# Altium schematic symbol library jlcpcb_2025_04_capacitors_extended_1210.schlib: 709 symbols (part 3 of 4) (continued)
## CL32X107MQVNNNE
designator C?  Capacitance: 100000000pF  (hidden comment: *)
Capacitor, Ceramic (MLCC), 100000000pF, ±20%, 6.3V, X6S, ±20%, SMD 1210; Manufacturer: Samsung Electro-Mechanics; Manufacturer Part Number: CL32X107MQVNNNE; Package Size: 1210; JLCPCB Basic Part: No; JLCPCB Part Number: C3039693; Supplier 1: LCSC; Category: Capacitors - MLCC; Supplier Part Number 1: C3039693; Tolerance: ±20%; Voltage Rating: 6.3V; Temperature Coefficient: X6S; RoHS: Yes; ComponentLink1Description: Datasheet; ComponentLink1URL: https://wmsc.lcsc.com/wmsc/upload/file/pdf/v2/lcsc/2206221801_Samsung-Electro-Mechanics-CL32X107MQVNNNE_C3039693.pdf; ComponentLink2Description: JLCPCB Part URL; ComponentLink2URL: https://jlcpcb.com/partdetail/C3039693; ComponentLink3Description: LCSC Part URL; ComponentLink3URL: https://lcsc.com/product-detail/Multilayer-Ceramic-Capacitors-MLCC---SMD-SMT_Samsung-Electro-Mechanics-Samsung-Electro-Mechanics-CL32X107MQVNNNE_C3039693.html; ComponentLink4Description: Samsung Component Library; ComponentLink4URL: https://weblib.samsungsem.com/mlcc/mlcc-ec.do?partNumber=CL32X107MQVNNN
footprint CAP-1210 (1210 (3225M) Capacitor)
pins: 1, 2

## CL32X107MQVNNWE
designator C?  Capacitance: 100uF  (hidden comment: *)
Capacitor, Ceramic (MLCC), 100uF, ±20%, 6.3V, X6S, ±20%, SMD 1210; Manufacturer: Samsung Electro-Mechanics; Manufacturer Part Number: CL32X107MQVNNWE; Package Size: 1210; JLCPCB Basic Part: No; JLCPCB Part Number: C2762605; Supplier 1: LCSC; Category: Capacitors - MLCC; Supplier Part Number 1: C2762605; Tolerance: ±20%; Voltage Rating: 6.3V; Temperature Coefficient: X6S; RoHS: Yes; ComponentLink1Description: Datasheet; ComponentLink1URL: https://wmsc.lcsc.com/wmsc/upload/file/pdf/v2/lcsc/2103242011_Samsung-Electro-Mechanics-CL32X107MQVNNWE_C2762605.pdf; ComponentLink2Description: JLCPCB Part URL; ComponentLink2URL: https://jlcpcb.com/partdetail/C2762605; ComponentLink3Description: LCSC Part URL; ComponentLink3URL: https://lcsc.com/product-detail/Multilayer-Ceramic-Capacitors-MLCC---SMD-SMT_Samsung-Electro-Mechanics-Samsung-Electro-Mechanics-CL32X107MQVNNWE_C2762605.html; ComponentLink4Description: Samsung Component Library; ComponentLink4URL: https://weblib.samsungsem.com/mlcc/mlcc-ec.do?partNumber=CL32X107MQVNNW
footprint CAP-1210 (1210 (3225M) Capacitor)
pins: 1, 2

## CL32Y106KBJ4PNE
designator C?  Capacitance: 10uF  (hidden comment: *)
Capacitor, Ceramic (MLCC), 10uF, ±10%, 50V, X7S, ±10%, SMD 1210; Manufacturer: Samsung Electro-Mechanics; Manufacturer Part Number: CL32Y106KBJ4PNE; Package Size: 1210; JLCPCB Basic Part: No; JLCPCB Part Number: C307374; Supplier 1: LCSC; Category: Capacitors - MLCC; Supplier Part Number 1: C307374; Tolerance: ±10%; Voltage Rating: 50V; Temperature Coefficient: X7S; RoHS: Yes; ComponentLink1Description: Datasheet; ComponentLink1URL: https://wmsc.lcsc.com/wmsc/upload/file/pdf/v2/lcsc/2304140030_Samsung-Electro-Mechanics-CL32Y106KBJ4PNE_C307374.pdf; ComponentLink2Description: JLCPCB Part URL; ComponentLink2URL: https://jlcpcb.com/partdetail/C307374; ComponentLink3Description: LCSC Part URL; ComponentLink3URL: https://lcsc.com/product-detail/Multilayer-Ceramic-Capacitors-MLCC---SMD-SMT_Samsung-Electro-Mechanics-Samsung-Electro-Mechanics-CL32Y106KBJ4PNE_C307374.html; ComponentLink4Description: Samsung Component Library; ComponentLink4URL: https://weblib.samsungsem.com/mlcc/mlcc-ec.do?partNumber=CL32Y106KBJ4PN
footprint CAP-1210 (1210 (3225M) Capacitor)
pins: 1, 2

## CL32Y106KBJVPJE
designator C?  Capacitance: 10uF  (hidden comment: *)
Capacitor, Ceramic (MLCC), 10uF, 50V, SMD 1210; Manufacturer: Samsung Electro-Mechanics; Manufacturer Part Number: CL32Y106KBJVPJE; Package Size: 1210; JLCPCB Basic Part: No; JLCPCB Part Number: C2803393; Supplier 1: LCSC; Category: Capacitors - MLCC; Supplier Part Number 1: C2803393; Voltage Rating: 50V; RoHS: Yes; ComponentLink1Description: Datasheet; ComponentLink1URL: https://wmsc.lcsc.com/wmsc/upload/file/pdf/v2/lcsc/2304140030_Samsung-Electro-Mechanics-CL32Y106KBJVPJE_C2803393.pdf; ComponentLink2Description: JLCPCB Part URL; ComponentLink2URL: https://jlcpcb.com/partdetail/C2803393; ComponentLink3Description: LCSC Part URL; ComponentLink3URL: https://lcsc.com/product-detail/Multilayer-Ceramic-Capacitors-MLCC---SMD-SMT_Samsung-Electro-Mechanics-Samsung-Electro-Mechanics-CL32Y106KBJVPJE_C2803393.html; ComponentLink4Description: Samsung Component Library; ComponentLink4URL: https://weblib.samsungsem.com/mlcc/mlcc-ec.do?partNumber=CL32Y106KBJVPJ
footprint CAP-1210 (1210 (3225M) Capacitor)
pins: 1, 2

## CL32Y226KAVVPNE
designator C?  Capacitance: 22uF  (hidden comment: *)
Capacitor, Ceramic (MLCC), 22uF, 25V, SMD 1210; Manufacturer: Samsung Electro-Mechanics; Manufacturer Part Number: CL32Y226KAVVPNE; Package Size: 1210; JLCPCB Basic Part: No; JLCPCB Part Number: C2803395; Supplier 1: LCSC; Category: Capacitors - MLCC; Supplier Part Number 1: C2803395; Voltage Rating: 25V; RoHS: Yes; ComponentLink1Description: Datasheet; ComponentLink1URL: https://wmsc.lcsc.com/wmsc/upload/file/pdf/v2/lcsc/2304140030_Samsung-Electro-Mechanics-CL32Y226KAVVPNE_C2803395.pdf; ComponentLink2Description: JLCPCB Part URL; ComponentLink2URL: https://jlcpcb.com/partdetail/C2803395; ComponentLink3Description: LCSC Part URL; ComponentLink3URL: https://lcsc.com/product-detail/Multilayer-Ceramic-Capacitors-MLCC---SMD-SMT_Samsung-Electro-Mechanics-Samsung-Electro-Mechanics-CL32Y226KAVVPNE_C2803395.html; ComponentLink4Description: Samsung Component Library; ComponentLink4URL: https://weblib.samsungsem.com/mlcc/mlcc-ec.do?partNumber=CL32Y226KAVVPN
footprint CAP-1210 (1210 (3225M) Capacitor)
pins: 1, 2

## CL32Y475KCIVPNE
designator C?  Capacitance: 4.7uF  (hidden comment: *)
Capacitor, Ceramic (MLCC), 4.7uF, ±10%, 100V, X7S, ±10%, SMD 1210; Manufacturer: Samsung Electro-Mechanics; Manufacturer Part Number: CL32Y475KCIVPNE; Package Size: 1210; JLCPCB Basic Part: No; JLCPCB Part Number: C2803397; Supplier 1: LCSC; Category: Capacitors - MLCC; Supplier Part Number 1: C2803397; Tolerance: ±10%; Voltage Rating: 100V; Temperature Coefficient: X7S; RoHS: Yes; ComponentLink1Description: Datasheet; ComponentLink1URL: https://wmsc.lcsc.com/wmsc/upload/file/pdf/v2/lcsc/2202131900_Samsung-Electro-Mechanics-CL32Y475KCIVPNE_C2803397.pdf; ComponentLink2Description: JLCPCB Part URL; ComponentLink2URL: https://jlcpcb.com/partdetail/C2803397; ComponentLink3Description: LCSC Part URL; ComponentLink3URL: https://lcsc.com/product-detail/Multilayer-Ceramic-Capacitors-MLCC---SMD-SMT_Samsung-Electro-Mechanics-Samsung-Electro-Mechanics-CL32Y475KCIVPNE_C2803397.html; ComponentLink4Description: Samsung Component Library; ComponentLink4URL: https://weblib.samsungsem.com/mlcc/mlcc-ec.do?partNumber=CL32Y475KCIVPN
footprint CAP-1210 (1210 (3225M) Capacitor)
pins: 1, 2

## CNA6P1X7R1H106KT000A
designator C?  Capacitance: 10uF  (hidden comment: *)
Capacitor, Ceramic (MLCC), 10uF, ±10%, 50V, X7R, ±10%, SMD 1210; Manufacturer: TDK; Manufacturer Part Number: CNA6P1X7R1H106KT000A; Package Size: 1210; JLCPCB Basic Part: No; JLCPCB Part Number: C694544; Supplier 1: LCSC; Category: Capacitors - MLCC; Supplier Part Number 1: C694544; Tolerance: ±10%; Voltage Rating: 50V; Temperature Coefficient: X7R; RoHS: Yes; ComponentLink1Description: Datasheet; ComponentLink1URL: https://wmsc.lcsc.com/wmsc/upload/file/pdf/v2/lcsc/2011021105_TDK-CNA6P1X7R1H106KT000A_C694544.pdf; ComponentLink2Description: JLCPCB Part URL; ComponentLink2URL: https://jlcpcb.com/partdetail/C694544; ComponentLink3Description: LCSC Part URL; ComponentLink3URL: https://lcsc.com/product-detail/Multilayer-Ceramic-Capacitors-MLCC---SMD-SMT_TDK-TDK-CNA6P1X7R1H106KT000A_C694544.html
footprint CAP-1210 (1210 (3225M) Capacitor)
pins: 1, 2

## CS3225X5R226K160NRL
designator C?  Capacitance: 22uF  (hidden comment: *)
Capacitor, Ceramic (MLCC), 22uF, ±10%, 16V, X5R, ±10%, SMD 1210; Manufacturer: Samwha Capacitor; Manufacturer Part Number: CS3225X5R226K160NRL; Package Size: 1210; JLCPCB Basic Part: No; JLCPCB Part Number: C2918506; Supplier 1: LCSC; Category: Capacitors - MLCC; Supplier Part Number 1: C2918506; Tolerance: ±10%; Voltage Rating: 16V; Temperature Coefficient: X5R; RoHS: Yes; ComponentLink1Description: Datasheet; ComponentLink1URL: https://wmsc.lcsc.com/wmsc/upload/file/pdf/v2/lcsc/2111172030_Samwha-Capacitor-CS3225X5R226K160NRL_C2918506.pdf; ComponentLink2Description: JLCPCB Part URL; ComponentLink2URL: https://jlcpcb.com/partdetail/C2918506; ComponentLink3Description: LCSC Part URL; ComponentLink3URL: https://lcsc.com/product-detail/Multilayer-Ceramic-Capacitors-MLCC---SMD-SMT_Samwha-Capacitor-Samwha-Capacitor-CS3225X5R226K160NRL_C2918506.html
footprint CAP-1210 (1210 (3225M) Capacitor)
pins: 1, 2

## CS3225X5R226K250NRL
designator C?  Capacitance: 22uF  (hidden comment: *)
Capacitor, Ceramic (MLCC), 22uF, ±10%, 25V, X5R, ±10%, SMD 1210; Manufacturer: Samwha Capacitor; Manufacturer Part Number: CS3225X5R226K250NRL; Package Size: 1210; JLCPCB Basic Part: No; JLCPCB Part Number: C2918488; Supplier 1: LCSC; Category: Capacitors - MLCC; Supplier Part Number 1: C2918488; Tolerance: ±10%; Voltage Rating: 25V; Temperature Coefficient: X5R; RoHS: Yes; ComponentLink1Description: Datasheet; ComponentLink1URL: https://wmsc.lcsc.com/wmsc/upload/file/pdf/v2/lcsc/2111172030_Samwha-Capacitor-CS3225X5R226K250NRL_C2918488.pdf; ComponentLink2Description: JLCPCB Part URL; ComponentLink2URL: https://jlcpcb.com/partdetail/C2918488; ComponentLink3Description: LCSC Part URL; ComponentLink3URL: https://lcsc.com/product-detail/Multilayer-Ceramic-Capacitors-MLCC---SMD-SMT_Samwha-Capacitor-Samwha-Capacitor-CS3225X5R226K250NRL_C2918488.html
footprint CAP-1210 (1210 (3225M) Capacitor)
pins: 1, 2

## CS3225X5R476K160NRL
designator C?  Capacitance: 47uF  (hidden comment: *)
Capacitor, Ceramic (MLCC), 47uF, ±10%, 16V, X5R, ±10%, SMD 1210; Manufacturer: Samwha Capacitor; Manufacturer Part Number: CS3225X5R476K160NRL; Package Size: 1210; JLCPCB Basic Part: No; JLCPCB Part Number: C2918513; Supplier 1: LCSC; Category: Capacitors - MLCC; Supplier Part Number 1: C2918513; Tolerance: ±10%; Voltage Rating: 16V; Temperature Coefficient: X5R; RoHS: Yes; ComponentLink1Description: Datasheet; ComponentLink1URL: https://wmsc.lcsc.com/wmsc/upload/file/pdf/v2/lcsc/2212021100_Samwha-Capacitor-CS3225X5R476K160NRL_C2918513.pdf; ComponentLink2Description: JLCPCB Part URL; ComponentLink2URL: https://jlcpcb.com/partdetail/C2918513; ComponentLink3Description: LCSC Part URL; ComponentLink3URL: https://lcsc.com/product-detail/Multilayer-Ceramic-Capacitors-MLCC---SMD-SMT_Samwha-Capacitor-Samwha-Capacitor-CS3225X5R476K160NRL_C2918513.html
footprint CAP-1210 (1210 (3225M) Capacitor)
pins: 1, 2

## CS3225X7R106K250NRK
designator C?  Capacitance: 10uF  (hidden comment: *)
Capacitor, Ceramic (MLCC), 10uF, ±10%, 25V, X7R, ±10%, SMD 1210; Manufacturer: Samwha Capacitor; Manufacturer Part Number: CS3225X7R106K250NRK; Package Size: 1210; JLCPCB Basic Part: No; JLCPCB Part Number: C2918497; Supplier 1: LCSC; Category: Capacitors - MLCC; Supplier Part Number 1: C2918497; Tolerance: ±10%; Voltage Rating: 25V; Temperature Coefficient: X7R; RoHS: Yes; ComponentLink1Description: Datasheet; ComponentLink1URL: https://wmsc.lcsc.com/wmsc/upload/file/pdf/v2/lcsc/2111172030_Samwha-Capacitor-CS3225X7R106K250NRK_C2918497.pdf; ComponentLink2Description: JLCPCB Part URL; ComponentLink2URL: https://jlcpcb.com/partdetail/C2918497; ComponentLink3Description: LCSC Part URL; ComponentLink3URL: https://lcsc.com/product-detail/Multilayer-Ceramic-Capacitors-MLCC---SMD-SMT_Samwha-Capacitor-Samwha-Capacitor-CS3225X7R106K250NRK_C2918497.html
footprint CAP-1210 (1210 (3225M) Capacitor)
pins: 1, 2

## CS3225X7R106K500NRL
designator C?  Capacitance: 10uF  (hidden comment: *)
Capacitor, Ceramic (MLCC), 10uF, 50V, X7R, SMD 1210; Manufacturer: Samwha Capacitor; Manufacturer Part Number: CS3225X7R106K500NRL; Package Size: 1210; JLCPCB Basic Part: No; JLCPCB Part Number: C2918502; Supplier 1: LCSC; Category: Capacitors - MLCC; Supplier Part Number 1: C2918502; Voltage Rating: 50V; Temperature Coefficient: X7R; RoHS: Yes; ComponentLink1Description: Datasheet; ComponentLink1URL: https://wmsc.lcsc.com/wmsc/upload/file/pdf/v2/lcsc/2308151448_Samwha-Capacitor-CS3225X7R106K500NRL_C2918502.pdf; ComponentLink2Description: JLCPCB Part URL; ComponentLink2URL: https://jlcpcb.com/partdetail/C2918502; ComponentLink3Description: LCSC Part URL; ComponentLink3URL: https://lcsc.com/product-detail/Multilayer-Ceramic-Capacitors-MLCC---SMD-SMT_Samwha-Capacitor-Samwha-Capacitor-CS3225X7R106K500NRL_C2918502.html
footprint CAP-1210 (1210 (3225M) Capacitor)
pins: 1, 2

## CS3225X7R225K101NRK
designator C?  Capacitance: 2.2uF  (hidden comment: *)
Capacitor, Ceramic (MLCC), 2.2uF, 100V, X7R, SMD 1210; Manufacturer: Samwha Capacitor; Manufacturer Part Number: CS3225X7R225K101NRK; Package Size: 1210; JLCPCB Basic Part: No; JLCPCB Part Number: C2900749; Supplier 1: LCSC; Category: Capacitors - MLCC; Supplier Part Number 1: C2900749; Voltage Rating: 100V; Temperature Coefficient: X7R; RoHS: Yes; ComponentLink1Description: Datasheet; ComponentLink1URL: https://wmsc.lcsc.com/wmsc/upload/file/pdf/v2/lcsc/2110141830_Samwha-Capacitor-CS3225X7R225K101NRK_C2900749.pdf; ComponentLink2Description: JLCPCB Part URL; ComponentLink2URL: https://jlcpcb.com/partdetail/C2900749; ComponentLink3Description: LCSC Part URL; ComponentLink3URL: https://lcsc.com/product-detail/Multilayer-Ceramic-Capacitors-MLCC---SMD-SMT_Samwha-Capacitor-Samwha-Capacitor-CS3225X7R225K101NRK_C2900749.html
footprint CAP-1210 (1210 (3225M) Capacitor)
pins: 1, 2

## CS3225X7R226K160NRL
designator C?  Capacitance: 22uF  (hidden comment: *)
Capacitor, Ceramic (MLCC), 22uF, 16V, X7R, SMD 1210; Manufacturer: Samwha Capacitor; Manufacturer Part Number: CS3225X7R226K160NRL; Package Size: 1210; JLCPCB Basic Part: No; JLCPCB Part Number: C2918510; Supplier 1: LCSC; Category: Capacitors - MLCC; Supplier Part Number 1: C2918510; Voltage Rating: 16V; Temperature Coefficient: X7R; RoHS: Yes; ComponentLink1Description: Datasheet; ComponentLink1URL: https://wmsc.lcsc.com/wmsc/upload/file/pdf/v2/lcsc/2111172030_Samwha-Capacitor-CS3225X7R226K160NRL_C2918510.pdf; ComponentLink2Description: JLCPCB Part URL; ComponentLink2URL: https://jlcpcb.com/partdetail/C2918510; ComponentLink3Description: LCSC Part URL; ComponentLink3URL: https://lcsc.com/product-detail/Multilayer-Ceramic-Capacitors-MLCC---SMD-SMT_Samwha-Capacitor-Samwha-Capacitor-CS3225X7R226K160NRL_C2918510.html
footprint CAP-1210 (1210 (3225M) Capacitor)
pins: 1, 2

## CS3225X7R226K250NRL
designator C?  Capacitance: 22uF  (hidden comment: *)
Capacitor, Ceramic (MLCC), 22uF, ±10%, 25V, X7R, ±10%, SMD 1210; Manufacturer: Samwha Capacitor; Manufacturer Part Number: CS3225X7R226K250NRL; Package Size: 1210; JLCPCB Basic Part: No; JLCPCB Part Number: C2918511; Supplier 1: LCSC; Category: Capacitors - MLCC; Supplier Part Number 1: C2918511; Tolerance: ±10%; Voltage Rating: 25V; Temperature Coefficient: X7R; RoHS: Yes; ComponentLink1Description: Datasheet; ComponentLink1URL: https://wmsc.lcsc.com/wmsc/upload/file/pdf/v2/lcsc/2111172030_Samwha-Capacitor-CS3225X7R226K250NRL_C2918511.pdf; ComponentLink2Description: JLCPCB Part URL; ComponentLink2URL: https://jlcpcb.com/partdetail/C2918511; ComponentLink3Description: LCSC Part URL; ComponentLink3URL: https://lcsc.com/product-detail/Multilayer-Ceramic-Capacitors-MLCC---SMD-SMT_Samwha-Capacitor-Samwha-Capacitor-CS3225X7R226K250NRL_C2918511.html
footprint CAP-1210 (1210 (3225M) Capacitor)
pins: 1, 2

## CS3225X7R476K6R3NRL
designator C?  Capacitance: 47uF  (hidden comment: *)
Capacitor, Ceramic (MLCC), 47uF, ±10%, 6.3V, X7R, ±10%, SMD 1210; Manufacturer: Samwha Capacitor; Manufacturer Part Number: CS3225X7R476K6R3NRL; Package Size: 1210; JLCPCB Basic Part: No; JLCPCB Part Number: C2918514; Supplier 1: LCSC; Category: Capacitors - MLCC; Supplier Part Number 1: C2918514; Tolerance: ±10%; Voltage Rating: 6.3V; Temperature Coefficient: X7R; RoHS: Yes; ComponentLink1Description: Datasheet; ComponentLink1URL: https://wmsc.lcsc.com/wmsc/upload/file/pdf/v2/lcsc/2111172030_Samwha-Capacitor-CS3225X7R476K6R3NRL_C2918514.pdf; ComponentLink2Description: JLCPCB Part URL; ComponentLink2URL: https://jlcpcb.com/partdetail/C2918514; ComponentLink3Description: LCSC Part URL; ComponentLink3URL: https://lcsc.com/product-detail/Multilayer-Ceramic-Capacitors-MLCC---SMD-SMT_Samwha-Capacitor-Samwha-Capacitor-CS3225X7R476K6R3NRL_C2918514.html
footprint CAP-1210 (1210 (3225M) Capacitor)
pins: 1, 2

## CS3225X7R476K100NRL
designator C?  Capacitance: 47uF  (hidden comment: *)
Capacitor, Ceramic (MLCC), 47uF, ±10%, 10V, X7R, ±10%, SMD 1210; Manufacturer: Samwha Capacitor; Manufacturer Part Number: CS3225X7R476K100NRL; Package Size: 1210; JLCPCB Basic Part: No; JLCPCB Part Number: C5189825; Supplier 1: LCSC; Category: Capacitors - MLCC; Supplier Part Number 1: C5189825; Tolerance: ±10%; Voltage Rating: 10V; Temperature Coefficient: X7R; RoHS: Yes; ComponentLink1Description: Datasheet; ComponentLink1URL: https://wmsc.lcsc.com/wmsc/upload/file/pdf/v2/lcsc/2210121101_Samwha-Capacitor-CS3225X7R476K100NRL_C5189825.pdf; ComponentLink2Description: JLCPCB Part URL; ComponentLink2URL: https://jlcpcb.com/partdetail/C5189825; ComponentLink3Description: LCSC Part URL; ComponentLink3URL: https://lcsc.com/product-detail/Multilayer-Ceramic-Capacitors-MLCC---SMD-SMT_Samwha-Capacitor-Samwha-Capacitor-CS3225X7R476K100NRL_C5189825.html
footprint CAP-1210 (1210 (3225M) Capacitor)
pins: 1, 2

## CS3225X7R476K160NRL
designator C?  Capacitance: 47uF  (hidden comment: *)
Capacitor, Ceramic (MLCC), 47uF, ±10%, 16V, X7R, ±10%, SMD 1210; Manufacturer: Samwha Capacitor; Manufacturer Part Number: CS3225X7R476K160NRL; Package Size: 1210; JLCPCB Basic Part: No; JLCPCB Part Number: C5440143; Supplier 1: LCSC; Category: Capacitors - MLCC; Supplier Part Number 1: C5440143; Tolerance: ±10%; Voltage Rating: 16V; Temperature Coefficient: X7R; RoHS: Yes; ComponentLink1Description: Datasheet; ComponentLink2Description: JLCPCB Part URL; ComponentLink2URL: https://jlcpcb.com/partdetail/C5440143; ComponentLink3Description: LCSC Part URL; ComponentLink3URL: https://lcsc.com/product-detail/Multilayer-Ceramic-Capacitors-MLCC---SMD-SMT_Samwha-Capacitor-Samwha-Capacitor-CS3225X7R476K160NRL_C5440143.html
footprint CAP-1210 (1210 (3225M) Capacitor)
pins: 1, 2

## CS3225X7S106K500NRL
designator C?  Capacitance: 10uF  (hidden comment: *)
Capacitor, Ceramic (MLCC), 10uF, ±10%, 50V, ±10%, SMD 1210; Manufacturer: Samwha Capacitor; Manufacturer Part Number: CS3225X7S106K500NRL; Package Size: 1210; JLCPCB Basic Part: No; JLCPCB Part Number: C920962; Supplier 1: LCSC; Category: Capacitors - MLCC; Supplier Part Number 1: C920962; Tolerance: ±10%; Voltage Rating: 50V; RoHS: Yes; ComponentLink1Description: Datasheet; ComponentLink2Description: JLCPCB Part URL; ComponentLink2URL: https://jlcpcb.com/partdetail/C920962; ComponentLink3Description: LCSC Part URL; ComponentLink3URL: https://lcsc.com/product-detail/Multilayer-Ceramic-Capacitors-MLCC---SMD-SMT_Samwha-Capacitor-Samwha-Capacitor-CS3225X7S106K500NRL_C920962.html
footprint CAP-1210 (1210 (3225M) Capacitor)
pins: 1, 2

## CS3225X7S476K160NRL
designator C?  Capacitance: 47000000pF  (hidden comment: *)
Capacitor, Ceramic (MLCC), 47000000pF, ±10%, 16V, X7S, ±10%, SMD 1210; Manufacturer: Samwha Capacitor; Manufacturer Part Number: CS3225X7S476K160NRL; Package Size: 1210; JLCPCB Basic Part: No; JLCPCB Part Number: C5252683; Supplier 1: LCSC; Category: Capacitors - MLCC; Supplier Part Number 1: C5252683; Tolerance: ±10%; Voltage Rating: 16V; Temperature Coefficient: X7S; RoHS: Yes; ComponentLink1Description: Datasheet; ComponentLink1URL: https://wmsc.lcsc.com/wmsc/upload/file/pdf/v2/lcsc/2306061636_Samwha-Capacitor-CS3225X7S476K160NRL_C5252683.pdf; ComponentLink2Description: JLCPCB Part URL; ComponentLink2URL: https://jlcpcb.com/partdetail/C5252683; ComponentLink3Description: LCSC Part URL; ComponentLink3URL: https://lcsc.com/product-detail/Multilayer-Ceramic-Capacitors-MLCC---SMD-SMT_Samwha-Capacitor-Samwha-Capacitor-CS3225X7S476K160NRL_C5252683.html
footprint CAP-1210 (1210 (3225M) Capacitor)
pins: 1, 2

## EMK325ABJ107MM-P
designator C?  Capacitance: 100uF  (hidden comment: *)
Capacitor, Ceramic (MLCC), 100uF, ±20%, 16V, X5R, ±20%, SMD 1210; Manufacturer: Taiyo Yuden; Manufacturer Part Number: EMK325ABJ107MM-P; Package Size: 1210; JLCPCB Basic Part: No; JLCPCB Part Number: C90143; Supplier 1: LCSC; Category: Capacitors - MLCC; Supplier Part Number 1: C90143; Tolerance: ±20%; Voltage Rating: 16V; Temperature Coefficient: X5R; RoHS: Yes; ComponentLink1Description: Datasheet; ComponentLink1URL: https://wmsc.lcsc.com/wmsc/upload/file/pdf/v2/lcsc/2405090920_Taiyo-Yuden-EMK325ABJ107MM-P_C90143.pdf; ComponentLink2Description: JLCPCB Part URL; ComponentLink2URL: https://jlcpcb.com/partdetail/C90143; ComponentLink3Description: LCSC Part URL; ComponentLink3URL: https://lcsc.com/product-detail/Multilayer-Ceramic-Capacitors-MLCC---SMD-SMT_Taiyo-Yuden-Taiyo-Yuden-EMK325ABJ107MM-P_C90143.html
footprint CAP-1210 (1210 (3225M) Capacitor)
pins: 1, 2

## EMK325ABJ107MM-T
designator C?  Capacitance: 100uF  (hidden comment: *)
Capacitor, Ceramic (MLCC), 100uF, ±20%, 16V, X5R, ±20%, SMD 1210; Manufacturer: Taiyo Yuden; Manufacturer Part Number: EMK325ABJ107MM-T; Package Size: 1210; JLCPCB Basic Part: No; JLCPCB Part Number: C394395; Supplier 1: LCSC; Category: Capacitors - MLCC; Supplier Part Number 1: C394395; Tolerance: ±20%; Voltage Rating: 16V; Temperature Coefficient: X5R; RoHS: Yes; ComponentLink1Description: Datasheet; ComponentLink1URL: https://wmsc.lcsc.com/wmsc/upload/file/pdf/v2/lcsc/2211282230_Taiyo-Yuden-EMK325ABJ107MM-T_C394395.pdf; ComponentLink2Description: JLCPCB Part URL; ComponentLink2URL: https://jlcpcb.com/partdetail/C394395; ComponentLink3Description: LCSC Part URL; ComponentLink3URL: https://lcsc.com/product-detail/Multilayer-Ceramic-Capacitors-MLCC---SMD-SMT_Taiyo-Yuden-Taiyo-Yuden-EMK325ABJ107MM-T_C394395.html
footprint CAP-1210 (1210 (3225M) Capacitor)
pins: 1, 2

## EMK325AC6476MM-P
designator C?  Capacitance: 47uF  (hidden comment: *)
Capacitor, Ceramic (MLCC), 47uF, ±20%, 16V, X6S, ±20%, SMD 1210; Manufacturer: Taiyo Yuden; Manufacturer Part Number: EMK325AC6476MM-P; Package Size: 1210; JLCPCB Basic Part: No; JLCPCB Part Number: C2171698; Supplier 1: LCSC; Category: Capacitors - MLCC; Supplier Part Number 1: C2171698; Tolerance: ±20%; Voltage Rating: 16V; Temperature Coefficient: X6S; RoHS: Yes; ComponentLink1Description: Datasheet; ComponentLink1URL: https://wmsc.lcsc.com/wmsc/upload/file/pdf/v2/lcsc/2309051414_Taiyo-Yuden-EMK325AC6476MM-P_C2171698.pdf; ComponentLink2Description: JLCPCB Part URL; ComponentLink2URL: https://jlcpcb.com/partdetail/C2171698; ComponentLink3Description: LCSC Part URL; ComponentLink3URL: https://lcsc.com/product-detail/Multilayer-Ceramic-Capacitors-MLCC---SMD-SMT_Taiyo-Yuden-Taiyo-Yuden-EMK325AC6476MM-P_C2171698.html
footprint CAP-1210 (1210 (3225M) Capacitor)
pins: 1, 2

## EMK325AC6476MMMP
designator C?  Capacitance: 47uF  (hidden comment: *)
Capacitor, Ceramic (MLCC), 47uF, ±20%, 16V, X6S, ±20%, SMD 1210; Manufacturer: Taiyo Yuden; Manufacturer Part Number: EMK325AC6476MMMP; Package Size: 1210; JLCPCB Basic Part: No; JLCPCB Part Number: C2987841; Supplier 1: LCSC; Category: Capacitors - MLCC; Supplier Part Number 1: C2987841; Tolerance: ±20%; Voltage Rating: 16V; Temperature Coefficient: X6S; RoHS: Yes; ComponentLink1Description: Datasheet; ComponentLink1URL: https://wmsc.lcsc.com/wmsc/upload/file/pdf/v2/lcsc/2203311630_Taiyo-Yuden-EMK325AC6476MMMP_C2987841.pdf; ComponentLink2Description: JLCPCB Part URL; ComponentLink2URL: https://jlcpcb.com/partdetail/C2987841; ComponentLink3Description: LCSC Part URL; ComponentLink3URL: https://lcsc.com/product-detail/Multilayer-Ceramic-Capacitors-MLCC---SMD-SMT_Taiyo-Yuden-Taiyo-Yuden-EMK325AC6476MMMP_C2987841.html
footprint CAP-1210 (1210 (3225M) Capacitor)
pins: 1, 2

## EMK325B7226KM-PR
designator C?  Capacitance: 22uF  (hidden comment: *)
Capacitor, Ceramic (MLCC), 22uF, ±10%, 16V, X7R, ±10%, SMD 1210; Manufacturer: Taiyo Yuden; Manufacturer Part Number: EMK325B7226KM-PR; Package Size: 1210; JLCPCB Basic Part: No; JLCPCB Part Number: C412624; Supplier 1: LCSC; Category: Capacitors - MLCC; Supplier Part Number 1: C412624; Tolerance: ±10%; Voltage Rating: 16V; Temperature Coefficient: X7R; RoHS: Yes; ComponentLink1Description: Datasheet; ComponentLink1URL: https://wmsc.lcsc.com/wmsc/upload/file/pdf/v2/lcsc/2304140030_Taiyo-Yuden-EMK325B7226KM-PR_C412624.pdf; ComponentLink2Description: JLCPCB Part URL; ComponentLink2URL: https://jlcpcb.com/partdetail/C412624; ComponentLink3Description: LCSC Part URL; ComponentLink3URL: https://lcsc.com/product-detail/Multilayer-Ceramic-Capacitors-MLCC---SMD-SMT_Taiyo-Yuden-Taiyo-Yuden-EMK325B7226KM-PR_C412624.html
footprint CAP-1210 (1210 (3225M) Capacitor)
pins: 1, 2

## EMK325B7226KMHP
designator C?  Capacitance: 22uF  (hidden comment: *)
Capacitor, Ceramic (MLCC), 22uF, ±10%, 16V, X7R, ±10%, SMD 1210; Manufacturer: Taiyo Yuden; Manufacturer Part Number: EMK325B7226KMHP; Package Size: 1210; JLCPCB Basic Part: No; JLCPCB Part Number: C385908; Supplier 1: LCSC; Category: Capacitors - MLCC; Supplier Part Number 1: C385908; Tolerance: ±10%; Voltage Rating: 16V; Temperature Coefficient: X7R; RoHS: Yes; ComponentLink1Description: Datasheet; ComponentLink1URL: https://wmsc.lcsc.com/wmsc/upload/file/pdf/v2/lcsc/2304140030_Taiyo-Yuden-EMK325B7226KMHP_C385908.pdf; ComponentLink2Description: JLCPCB Part URL; ComponentLink2URL: https://jlcpcb.com/partdetail/C385908; ComponentLink3Description: LCSC Part URL; ComponentLink3URL: https://lcsc.com/product-detail/Multilayer-Ceramic-Capacitors-MLCC---SMD-SMT_Taiyo-Yuden-Taiyo-Yuden-EMK325B7226KMHP_C385908.html
footprint CAP-1210 (1210 (3225M) Capacitor)
pins: 1, 2

## EMK325BJ106KN-T
designator C?  Capacitance: 10uF  (hidden comment: *)
Capacitor, Ceramic (MLCC), 10uF, ±10%, 16V, X5R, ±10%, SMD 1210; Manufacturer: Taiyo Yuden; Manufacturer Part Number: EMK325BJ106KN-T; Package Size: 1210; JLCPCB Basic Part: No; JLCPCB Part Number: C92769; Supplier 1: LCSC; Category: Capacitors - MLCC; Supplier Part Number 1: C92769; Tolerance: ±10%; Voltage Rating: 16V; Temperature Coefficient: X5R; RoHS: Yes; ComponentLink1Description: Datasheet; ComponentLink1URL: https://wmsc.lcsc.com/wmsc/upload/file/pdf/v2/lcsc/2211282300_Taiyo-Yuden-EMK325BJ106KN-T_C92769.pdf; ComponentLink2Description: JLCPCB Part URL; ComponentLink2URL: https://jlcpcb.com/partdetail/C92769; ComponentLink3Description: LCSC Part URL; ComponentLink3URL: https://lcsc.com/product-detail/Multilayer-Ceramic-Capacitors-MLCC---SMD-SMT_Taiyo-Yuden-Taiyo-Yuden-EMK325BJ106KN-T_C92769.html
footprint CAP-1210 (1210 (3225M) Capacitor)
pins: 1, 2

## EMK325BJ106KNHT
designator C?  Capacitance: 10uF  (hidden comment: *)
Capacitor, Ceramic (MLCC), 10uF, ±10%, 16V, X5R, ±10%, SMD 1210; Manufacturer: Taiyo Yuden; Manufacturer Part Number: EMK325BJ106KNHT; Package Size: 1210; JLCPCB Basic Part: No; JLCPCB Part Number: C2175012; Supplier 1: LCSC; Category: Capacitors - MLCC; Supplier Part Number 1: C2175012; Tolerance: ±10%; Voltage Rating: 16V; Temperature Coefficient: X5R; RoHS: Yes; ComponentLink1Description: Datasheet; ComponentLink1URL: https://wmsc.lcsc.com/wmsc/upload/file/pdf/v2/lcsc/2211282000_Taiyo-Yuden-EMK325BJ106KNHT_C2175012.pdf; ComponentLink2Description: JLCPCB Part URL; ComponentLink2URL: https://jlcpcb.com/partdetail/C2175012; ComponentLink3Description: LCSC Part URL; ComponentLink3URL: https://lcsc.com/product-detail/Multilayer-Ceramic-Capacitors-MLCC---SMD-SMT_Taiyo-Yuden-Taiyo-Yuden-EMK325BJ106KNHT_C2175012.html
footprint CAP-1210 (1210 (3225M) Capacitor)
pins: 1, 2

## EMK325BJ226KM-P
designator C?  Capacitance: 22uF  (hidden comment: *)
Capacitor, Ceramic (MLCC), 22uF, ±10%, 16V, X5R, ±10%, SMD 1210; Manufacturer: Taiyo Yuden; Manufacturer Part Number: EMK325BJ226KM-P; Package Size: 1210; JLCPCB Basic Part: No; JLCPCB Part Number: C319200; Supplier 1: LCSC; Category: Capacitors - MLCC; Supplier Part Number 1: C319200; Tolerance: ±10%; Voltage Rating: 16V; Temperature Coefficient: X5R; RoHS: Yes; ComponentLink1Description: Datasheet; ComponentLink1URL: https://wmsc.lcsc.com/wmsc/upload/file/pdf/v2/lcsc/2304140030_Taiyo-Yuden-EMK325BJ226KM-P_C319200.pdf; ComponentLink2Description: JLCPCB Part URL; ComponentLink2URL: https://jlcpcb.com/partdetail/C319200; ComponentLink3Description: LCSC Part URL; ComponentLink3URL: https://lcsc.com/product-detail/Multilayer-Ceramic-Capacitors-MLCC---SMD-SMT_Taiyo-Yuden-Taiyo-Yuden-EMK325BJ226KM-P_C319200.html
footprint CAP-1210 (1210 (3225M) Capacitor)
pins: 1, 2

## EMK325BJ226KM-T
designator C?  Capacitance: 22uF  (hidden comment: *)
Capacitor, Ceramic (MLCC), 22uF, ±10%, 16V, X5R, ±10%, SMD 1210; Manufacturer: Taiyo Yuden; Manufacturer Part Number: EMK325BJ226KM-T; Package Size: 1210; JLCPCB Basic Part: No; JLCPCB Part Number: C89148; Supplier 1: LCSC; Category: Capacitors - MLCC; Supplier Part Number 1: C89148; Tolerance: ±10%; Voltage Rating: 16V; Temperature Coefficient: X5R; RoHS: Yes; ComponentLink1Description: Datasheet; ComponentLink1URL: https://wmsc.lcsc.com/wmsc/upload/file/pdf/v2/lcsc/2304140030_Taiyo-Yuden-EMK325BJ226KM-T_C89148.pdf; ComponentLink2Description: JLCPCB Part URL; ComponentLink2URL: https://jlcpcb.com/partdetail/C89148; ComponentLink3Description: LCSC Part URL; ComponentLink3URL: https://lcsc.com/product-detail/Multilayer-Ceramic-Capacitors-MLCC---SMD-SMT_Taiyo-Yuden-Taiyo-Yuden-EMK325BJ226KM-T_C89148.html
footprint CAP-1210 (1210 (3225M) Capacitor)
pins: 1, 2

## EMK325BJ226MD-T
designator C?  Capacitance: 22uF  (hidden comment: *)
Capacitor, Ceramic (MLCC), 22uF, ±20%, 16V, X5R, ±20%, SMD 1210; Manufacturer: Taiyo Yuden; Manufacturer Part Number: EMK325BJ226MD-T; Package Size: 1210; JLCPCB Basic Part: No; JLCPCB Part Number: C92771; Supplier 1: LCSC; Category: Capacitors - MLCC; Supplier Part Number 1: C92771; Tolerance: ±20%; Voltage Rating: 16V; Temperature Coefficient: X5R; RoHS: Yes; ComponentLink1Description: Datasheet; ComponentLink1URL: https://wmsc.lcsc.com/wmsc/upload/file/pdf/v2/lcsc/1810171817_Taiyo-Yuden-EMK325BJ226MD-T_C92771.pdf; ComponentLink2Description: JLCPCB Part URL; ComponentLink2URL: https://jlcpcb.com/partdetail/C92771; ComponentLink3Description: LCSC Part URL; ComponentLink3URL: https://lcsc.com/product-detail/Multilayer-Ceramic-Capacitors-MLCC---SMD-SMT_Taiyo-Yuden-Taiyo-Yuden-EMK325BJ226MD-T_C92771.html
footprint CAP-1210 (1210 (3225M) Capacitor)
pins: 1, 2

## EMK325BJ226MM-P
designator C?  Capacitance: 22uF  (hidden comment: *)
Capacitor, Ceramic (MLCC), 22uF, ±20%, 16V, X5R, ±20%, SMD 1210; Manufacturer: Taiyo Yuden; Manufacturer Part Number: EMK325BJ226MM-P; Package Size: 1210; JLCPCB Basic Part: No; JLCPCB Part Number: C268013; Supplier 1: LCSC; Category: Capacitors - MLCC; Supplier Part Number 1: C268013; Tolerance: ±20%; Voltage Rating: 16V; Temperature Coefficient: X5R; RoHS: Yes; ComponentLink1Description: Datasheet; ComponentLink1URL: https://wmsc.lcsc.com/wmsc/upload/file/pdf/v2/lcsc/2304140030_Taiyo-Yuden-EMK325BJ226MM-P_C268013.pdf; ComponentLink2Description: JLCPCB Part URL; ComponentLink2URL: https://jlcpcb.com/partdetail/C268013; ComponentLink3Description: LCSC Part URL; ComponentLink3URL: https://lcsc.com/product-detail/Multilayer-Ceramic-Capacitors-MLCC---SMD-SMT_Taiyo-Yuden-Taiyo-Yuden-EMK325BJ226MM-P_C268013.html
footprint CAP-1210 (1210 (3225M) Capacitor)
pins: 1, 2

## EMK325BJ226MM-T
designator C?  Capacitance: 22uF  (hidden comment: *)
Capacitor, Ceramic (MLCC), 22uF, ±20%, 16V, X5R, ±20%, SMD 1210; Manufacturer: Taiyo Yuden; Manufacturer Part Number: EMK325BJ226MM-T; Package Size: 1210; JLCPCB Basic Part: No; JLCPCB Part Number: C92772; Supplier 1: LCSC; Category: Capacitors - MLCC; Supplier Part Number 1: C92772; Tolerance: ±20%; Voltage Rating: 16V; Temperature Coefficient: X5R; RoHS: Yes; ComponentLink1Description: Datasheet; ComponentLink1URL: https://wmsc.lcsc.com/wmsc/upload/file/pdf/v2/lcsc/1810292010_Taiyo-Yuden-EMK325BJ226MM-T_C92772.pdf; ComponentLink2Description: JLCPCB Part URL; ComponentLink2URL: https://jlcpcb.com/partdetail/C92772; ComponentLink3Description: LCSC Part URL; ComponentLink3URL: https://lcsc.com/product-detail/Multilayer-Ceramic-Capacitors-MLCC---SMD-SMT_Taiyo-Yuden-Taiyo-Yuden-EMK325BJ226MM-T_C92772.html
footprint CAP-1210 (1210 (3225M) Capacitor)
pins: 1, 2

## EMK325BJ476KM-P
designator C?  Capacitance: 47uF  (hidden comment: *)
Capacitor, Ceramic (MLCC), 47uF, ±10%, 16V, X5R, ±10%, SMD 1210; Manufacturer: Taiyo Yuden; Manufacturer Part Number: EMK325BJ476KM-P; Package Size: 1210; JLCPCB Basic Part: No; JLCPCB Part Number: C555365; Supplier 1: LCSC; Category: Capacitors - MLCC; Supplier Part Number 1: C555365; Tolerance: ±10%; Voltage Rating: 16V; Temperature Coefficient: X5R; RoHS: Yes; ComponentLink1Description: Datasheet; ComponentLink1URL: https://wmsc.lcsc.com/wmsc/upload/file/pdf/v2/lcsc/2304140030_Taiyo-Yuden-EMK325BJ476KM-P_C555365.pdf; ComponentLink2Description: JLCPCB Part URL; ComponentLink2URL: https://jlcpcb.com/partdetail/C555365; ComponentLink3Description: LCSC Part URL; ComponentLink3URL: https://lcsc.com/product-detail/Multilayer-Ceramic-Capacitors-MLCC---SMD-SMT_Taiyo-Yuden-Taiyo-Yuden-EMK325BJ476KM-P_C555365.html
footprint CAP-1210 (1210 (3225M) Capacitor)
pins: 1, 2

## EMK325BJ476MM-P
designator C?  Capacitance: 47uF  (hidden comment: *)
Capacitor, Ceramic (MLCC), 47uF, ±20%, 16V, X5R, ±20%, SMD 1210; Manufacturer: Taiyo Yuden; Manufacturer Part Number: EMK325BJ476MM-P; Package Size: 1210; JLCPCB Basic Part: No; JLCPCB Part Number: C412625; Supplier 1: LCSC; Category: Capacitors - MLCC; Supplier Part Number 1: C412625; Tolerance: ±20%; Voltage Rating: 16V; Temperature Coefficient: X5R; RoHS: Yes; ComponentLink1Description: Datasheet; ComponentLink1URL: https://wmsc.lcsc.com/wmsc/upload/file/pdf/v2/lcsc/2311241745_Taiyo-Yuden-EMK325BJ476MM-P_C412625.pdf; ComponentLink2Description: JLCPCB Part URL; ComponentLink2URL: https://jlcpcb.com/partdetail/C412625; ComponentLink3Description: LCSC Part URL; ComponentLink3URL: https://lcsc.com/product-detail/Multilayer-Ceramic-Capacitors-MLCC---SMD-SMT_Taiyo-Yuden-Taiyo-Yuden-EMK325BJ476MM-P_C412625.html
footprint CAP-1210 (1210 (3225M) Capacitor)
pins: 1, 2

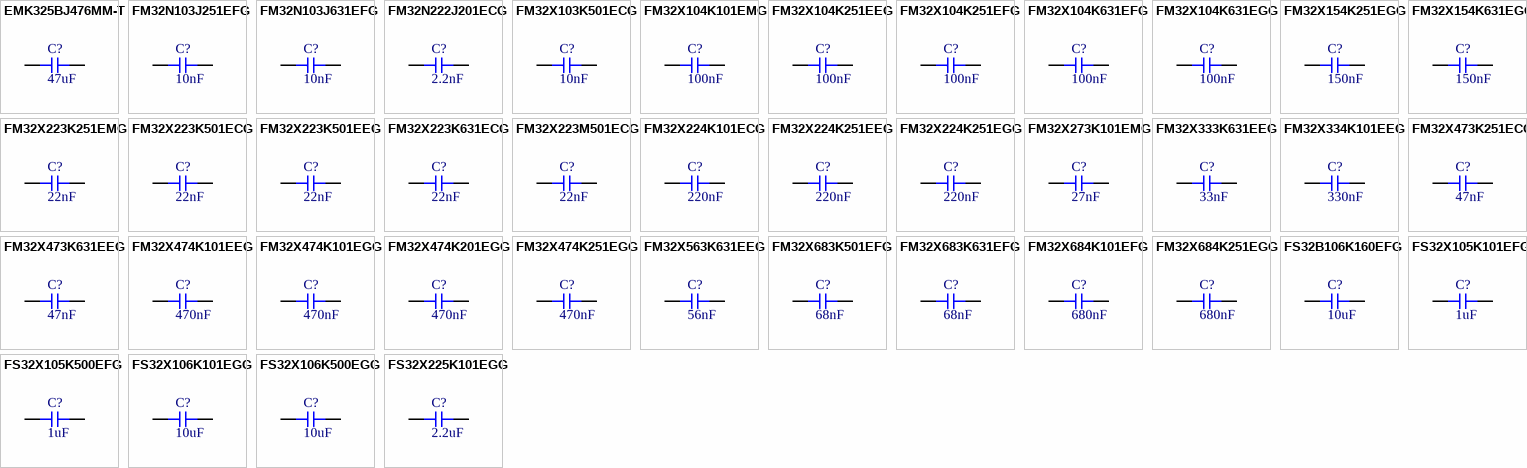
[diagram p11: symbols EMK325BJ476MM-T to FS32X225K101EGG]

## EMK325BJ476MM-T
designator C?  Capacitance: 47uF  (hidden comment: *)
Capacitor, Ceramic (MLCC), 47uF, ±20%, 16V, X5R, ±20%, SMD 1210; Manufacturer: Taiyo Yuden; Manufacturer Part Number: EMK325BJ476MM-T; Package Size: 1210; JLCPCB Basic Part: No; JLCPCB Part Number: C89147; Supplier 1: LCSC; Category: Capacitors - MLCC; Supplier Part Number 1: C89147; Tolerance: ±20%; Voltage Rating: 16V; Temperature Coefficient: X5R; RoHS: Yes; ComponentLink1Description: Datasheet; ComponentLink1URL: https://wmsc.lcsc.com/wmsc/upload/file/pdf/v2/lcsc/2304140030_Taiyo-Yuden-EMK325BJ476MM-T_C89147.pdf; ComponentLink2Description: JLCPCB Part URL; ComponentLink2URL: https://jlcpcb.com/partdetail/C89147; ComponentLink3Description: LCSC Part URL; ComponentLink3URL: https://lcsc.com/product-detail/Multilayer-Ceramic-Capacitors-MLCC---SMD-SMT_Taiyo-Yuden-Taiyo-Yuden-EMK325BJ476MM-T_C89147.html
footprint CAP-1210 (1210 (3225M) Capacitor)
pins: 1, 2

## FM32N103J251EFG
designator C?  Capacitance: 10nF  (hidden comment: *)
Capacitor, Ceramic (MLCC), 10nF, ±5%, 250V, NP0, ±5%, SMD 1210; Manufacturer: PSA(Prosperity Dielectrics); Manufacturer Part Number: FM32N103J251EFG; Package Size: 1210; JLCPCB Basic Part: No; JLCPCB Part Number: C692309; Supplier 1: LCSC; Category: Capacitors - MLCC; Supplier Part Number 1: C692309; Tolerance: ±5%; Voltage Rating: 250V; Temperature Coefficient: NP0; RoHS: Yes; ComponentLink1Description: Datasheet; ComponentLink1URL: https://wmsc.lcsc.com/wmsc/upload/file/pdf/v2/lcsc/2304140030_PSA-Prosperity-Dielectrics-FM32N103J251EFG_C692309.pdf; ComponentLink2Description: JLCPCB Part URL; ComponentLink2URL: https://jlcpcb.com/partdetail/C692309; ComponentLink3Description: LCSC Part URL; ComponentLink3URL: https://lcsc.com/product-detail/Multilayer-Ceramic-Capacitors-MLCC---SMD-SMT_PSAProsperity-Dielectrics-PSAProsperity-Dielectrics-FM32N103J251EFG_C692309.html
footprint CAP-1210 (1210 (3225M) Capacitor)
pins: 1, 2

## FM32N103J631EFG
designator C?  Capacitance: 10nF  (hidden comment: *)
Capacitor, Ceramic (MLCC), 10nF, ±5%, 630V, C0G, ±5%, SMD 1210; Manufacturer: PSA(Prosperity Dielectrics); Manufacturer Part Number: FM32N103J631EFG; Package Size: 1210; JLCPCB Basic Part: No; JLCPCB Part Number: C692315; Supplier 1: LCSC; Category: Capacitors - MLCC; Supplier Part Number 1: C692315; Tolerance: ±5%; Voltage Rating: 630V; Temperature Coefficient: C0G; RoHS: Yes; ComponentLink1Description: Datasheet; ComponentLink1URL: https://wmsc.lcsc.com/wmsc/upload/file/pdf/v2/lcsc/2304140030_PSA-Prosperity-Dielectrics-FM32N103J631EFG_C692315.pdf; ComponentLink2Description: JLCPCB Part URL; ComponentLink2URL: https://jlcpcb.com/partdetail/C692315; ComponentLink3Description: LCSC Part URL; ComponentLink3URL: https://lcsc.com/product-detail/Multilayer-Ceramic-Capacitors-MLCC---SMD-SMT_PSAProsperity-Dielectrics-PSAProsperity-Dielectrics-FM32N103J631EFG_C692315.html
footprint CAP-1210 (1210 (3225M) Capacitor)
pins: 1, 2

## FM32N222J201ECG
designator C?  Capacitance: 2.2nF  (hidden comment: *)
Capacitor, Ceramic (MLCC), 2.2nF, ±5%, 200V, C0G, ±5%, SMD 1210; Manufacturer: PSA(Prosperity Dielectrics); Manufacturer Part Number: FM32N222J201ECG; Package Size: 1210; JLCPCB Basic Part: No; JLCPCB Part Number: C2915726; Supplier 1: LCSC; Category: Capacitors - MLCC; Supplier Part Number 1: C2915726; Tolerance: ±5%; Voltage Rating: 200V; Temperature Coefficient: C0G; RoHS: Yes; ComponentLink1Description: Datasheet; ComponentLink1URL: https://wmsc.lcsc.com/wmsc/upload/file/pdf/v2/lcsc/2111172030_PSA-Prosperity-Dielectrics-FM32N222J201ECG_C2915726.pdf; ComponentLink2Description: JLCPCB Part URL; ComponentLink2URL: https://jlcpcb.com/partdetail/C2915726; ComponentLink3Description: LCSC Part URL; ComponentLink3URL: https://lcsc.com/product-detail/Multilayer-Ceramic-Capacitors-MLCC---SMD-SMT_PSAProsperity-Dielectrics-PSAProsperity-Dielectrics-FM32N222J201ECG_C2915726.html
footprint CAP-1210 (1210 (3225M) Capacitor)
pins: 1, 2

## FM32X103K501ECG
designator C?  Capacitance: 10nF  (hidden comment: *)
Capacitor, Ceramic (MLCC), 10nF, ±10%, 500V, X7R, ±10%, SMD 1210; Manufacturer: PSA(Prosperity Dielectrics); Manufacturer Part Number: FM32X103K501ECG; Package Size: 1210; JLCPCB Basic Part: No; JLCPCB Part Number: C2915727; Supplier 1: LCSC; Category: Capacitors - MLCC; Supplier Part Number 1: C2915727; Tolerance: ±10%; Voltage Rating: 500V; Temperature Coefficient: X7R; RoHS: Yes; ComponentLink1Description: Datasheet; ComponentLink1URL: https://wmsc.lcsc.com/wmsc/upload/file/pdf/v2/lcsc/2111161830_PSA-Prosperity-Dielectrics-FM32X103K501ECG_C2915727.pdf; ComponentLink2Description: JLCPCB Part URL; ComponentLink2URL: https://jlcpcb.com/partdetail/C2915727; ComponentLink3Description: LCSC Part URL; ComponentLink3URL: https://lcsc.com/product-detail/Multilayer-Ceramic-Capacitors-MLCC---SMD-SMT_PSAProsperity-Dielectrics-PSAProsperity-Dielectrics-FM32X103K501ECG_C2915727.html
footprint CAP-1210 (1210 (3225M) Capacitor)
pins: 1, 2

## FM32X104K101EMG
designator C?  Capacitance: 100nF  (hidden comment: *)
Capacitor, Ceramic (MLCC), 100nF, ±10%, 100V, X7R, ±10%, SMD 1210; Manufacturer: PSA(Prosperity Dielectrics); Manufacturer Part Number: FM32X104K101EMG; Package Size: 1210; JLCPCB Basic Part: No; JLCPCB Part Number: C436244; Supplier 1: LCSC; Category: Capacitors - MLCC; Supplier Part Number 1: C436244; Tolerance: ±10%; Voltage Rating: 100V; Temperature Coefficient: X7R; RoHS: Yes; ComponentLink1Description: Datasheet; ComponentLink1URL: https://wmsc.lcsc.com/wmsc/upload/file/pdf/v2/lcsc/2110191430_PSA-Prosperity-Dielectrics-FM32X104K101EMG_C436244.pdf; ComponentLink2Description: JLCPCB Part URL; ComponentLink2URL: https://jlcpcb.com/partdetail/C436244; ComponentLink3Description: LCSC Part URL; ComponentLink3URL: https://lcsc.com/product-detail/Multilayer-Ceramic-Capacitors-MLCC---SMD-SMT_PSAProsperity-Dielectrics-PSAProsperity-Dielectrics-FM32X104K101EMG_C436244.html
footprint CAP-1210 (1210 (3225M) Capacitor)
pins: 1, 2

## FM32X104K251EEG
designator C?  Capacitance: 100nF  (hidden comment: *)
Capacitor, Ceramic (MLCC), 100nF, ±10%, 250V, X7R, ±10%, SMD 1210; Manufacturer: PSA(Prosperity Dielectrics); Manufacturer Part Number: FM32X104K251EEG; Package Size: 1210; JLCPCB Basic Part: No; JLCPCB Part Number: C692284; Supplier 1: LCSC; Category: Capacitors - MLCC; Supplier Part Number 1: C692284; Tolerance: ±10%; Voltage Rating: 250V; Temperature Coefficient: X7R; RoHS: Yes; ComponentLink1Description: Datasheet; ComponentLink1URL: https://wmsc.lcsc.com/wmsc/upload/file/pdf/v2/lcsc/2304140030_PSA-Prosperity-Dielectrics-FM32X104K251EEG_C692284.pdf; ComponentLink2Description: JLCPCB Part URL; ComponentLink2URL: https://jlcpcb.com/partdetail/C692284; ComponentLink3Description: LCSC Part URL; ComponentLink3URL: https://lcsc.com/product-detail/Multilayer-Ceramic-Capacitors-MLCC---SMD-SMT_PSAProsperity-Dielectrics-PSAProsperity-Dielectrics-FM32X104K251EEG_C692284.html
footprint CAP-1210 (1210 (3225M) Capacitor)
pins: 1, 2

## FM32X104K251EFG
designator C?  Capacitance: 100nF  (hidden comment: *)
Capacitor, Ceramic (MLCC), 100nF, ±10%, 250V, ±10%, SMD 1210; Manufacturer: PSA(Prosperity Dielectrics); Manufacturer Part Number: FM32X104K251EFG; Package Size: 1210; JLCPCB Basic Part: No; JLCPCB Part Number: C2843406; Supplier 1: LCSC; Category: Capacitors - MLCC; Supplier Part Number 1: C2843406; Tolerance: ±10%; Voltage Rating: 250V; RoHS: Yes; ComponentLink1Description: Datasheet; ComponentLink1URL: https://wmsc.lcsc.com/wmsc/upload/file/pdf/v2/lcsc/2108072030_PSA-Prosperity-Dielectrics-FM32X104K251EFG_C2843406.pdf; ComponentLink2Description: JLCPCB Part URL; ComponentLink2URL: https://jlcpcb.com/partdetail/C2843406; ComponentLink3Description: LCSC Part URL; ComponentLink3URL: https://lcsc.com/product-detail/Multilayer-Ceramic-Capacitors-MLCC---SMD-SMT_PSAProsperity-Dielectrics-PSAProsperity-Dielectrics-FM32X104K251EFG_C2843406.html
footprint CAP-1210 (1210 (3225M) Capacitor)
pins: 1, 2

## FM32X104K631EFG
designator C?  Capacitance: 100nF  (hidden comment: *)
Capacitor, Ceramic (MLCC), 100nF, 630V, X7R, SMD 1210; Manufacturer: PSA(Prosperity Dielectrics); Manufacturer Part Number: FM32X104K631EFG; Package Size: 1210; JLCPCB Basic Part: No; JLCPCB Part Number: C2905788; Supplier 1: LCSC; Category: Capacitors - MLCC; Supplier Part Number 1: C2905788; Voltage Rating: 630V; Temperature Coefficient: X7R; RoHS: Yes; ComponentLink1Description: Datasheet; ComponentLink1URL: https://wmsc.lcsc.com/wmsc/upload/file/pdf/v2/lcsc/2110190930_PSA-Prosperity-Dielectrics-FM32X104K631EFG_C2905788.pdf; ComponentLink2Description: JLCPCB Part URL; ComponentLink2URL: https://jlcpcb.com/partdetail/C2905788; ComponentLink3Description: LCSC Part URL; ComponentLink3URL: https://lcsc.com/product-detail/Multilayer-Ceramic-Capacitors-MLCC---SMD-SMT_PSAProsperity-Dielectrics-PSAProsperity-Dielectrics-FM32X104K631EFG_C2905788.html
footprint CAP-1210 (1210 (3225M) Capacitor)
pins: 1, 2

## FM32X104K631EGG
designator C?  Capacitance: 100nF  (hidden comment: *)
Capacitor, Ceramic (MLCC), 100nF, ±10%, 630V, X7R, ±10%, SMD 1210; Manufacturer: PSA(Prosperity Dielectrics); Manufacturer Part Number: FM32X104K631EGG; Package Size: 1210; JLCPCB Basic Part: No; JLCPCB Part Number: C692295; Supplier 1: LCSC; Category: Capacitors - MLCC; Supplier Part Number 1: C692295; Tolerance: ±10%; Voltage Rating: 630V; Temperature Coefficient: X7R; RoHS: Yes; ComponentLink1Description: Datasheet; ComponentLink1URL: https://wmsc.lcsc.com/wmsc/upload/file/pdf/v2/lcsc/2304140030_PSA-Prosperity-Dielectrics-FM32X104K631EGG_C692295.pdf; ComponentLink2Description: JLCPCB Part URL; ComponentLink2URL: https://jlcpcb.com/partdetail/C692295; ComponentLink3Description: LCSC Part URL; ComponentLink3URL: https://lcsc.com/product-detail/Multilayer-Ceramic-Capacitors-MLCC---SMD-SMT_PSAProsperity-Dielectrics-PSAProsperity-Dielectrics-FM32X104K631EGG_C692295.html
footprint CAP-1210 (1210 (3225M) Capacitor)
pins: 1, 2

## FM32X154K251EGG
designator C?  Capacitance: 150nF  (hidden comment: *)
Capacitor, Ceramic (MLCC), 150nF, 250V, X7R, SMD 1210; Manufacturer: PSA(Prosperity Dielectrics); Manufacturer Part Number: FM32X154K251EGG; Package Size: 1210; JLCPCB Basic Part: No; JLCPCB Part Number: C2915729; Supplier 1: LCSC; Category: Capacitors - MLCC; Supplier Part Number 1: C2915729; Voltage Rating: 250V; Temperature Coefficient: X7R; RoHS: Yes; ComponentLink1Description: Datasheet; ComponentLink1URL: https://wmsc.lcsc.com/wmsc/upload/file/pdf/v2/lcsc/2111161830_PSA-Prosperity-Dielectrics-FM32X154K251EGG_C2915729.pdf; ComponentLink2Description: JLCPCB Part URL; ComponentLink2URL: https://jlcpcb.com/partdetail/C2915729; ComponentLink3Description: LCSC Part URL; ComponentLink3URL: https://lcsc.com/product-detail/Multilayer-Ceramic-Capacitors-MLCC---SMD-SMT_PSAProsperity-Dielectrics-PSAProsperity-Dielectrics-FM32X154K251EGG_C2915729.html
footprint CAP-1210 (1210 (3225M) Capacitor)
pins: 1, 2

## FM32X154K631EGG
designator C?  Capacitance: 150nF  (hidden comment: *)
Capacitor, Ceramic (MLCC), 150nF, ±10%, 630V, ±10%, SMD 1210; Manufacturer: PSA(Prosperity Dielectrics); Manufacturer Part Number: FM32X154K631EGG; Package Size: 1210; JLCPCB Basic Part: No; JLCPCB Part Number: C1021625; Supplier 1: LCSC; Category: Capacitors - MLCC; Supplier Part Number 1: C1021625; Tolerance: ±10%; Voltage Rating: 630V; RoHS: Yes; ComponentLink1Description: Datasheet; ComponentLink1URL: https://wmsc.lcsc.com/wmsc/upload/file/pdf/v2/lcsc/2304140030_PSA-Prosperity-Dielectrics-FM32X154K631EGG_C1021625.pdf; ComponentLink2Description: JLCPCB Part URL; ComponentLink2URL: https://jlcpcb.com/partdetail/C1021625; ComponentLink3Description: LCSC Part URL; ComponentLink3URL: https://lcsc.com/product-detail/Multilayer-Ceramic-Capacitors-MLCC---SMD-SMT_PSAProsperity-Dielectrics-PSAProsperity-Dielectrics-FM32X154K631EGG_C1021625.html
footprint CAP-1210 (1210 (3225M) Capacitor)
pins: 1, 2

## FM32X223K251EMG
designator C?  Capacitance: 22nF  (hidden comment: *)
Capacitor, Ceramic (MLCC), 22nF, ±10%, 250V, X7R, ±10%, SMD 1210; Manufacturer: PSA(Prosperity Dielectrics); Manufacturer Part Number: FM32X223K251EMG; Package Size: 1210; JLCPCB Basic Part: No; JLCPCB Part Number: C692285; Supplier 1: LCSC; Category: Capacitors - MLCC; Supplier Part Number 1: C692285; Tolerance: ±10%; Voltage Rating: 250V; Temperature Coefficient: X7R; RoHS: Yes; ComponentLink1Description: Datasheet; ComponentLink1URL: https://wmsc.lcsc.com/wmsc/upload/file/pdf/v2/lcsc/2304140030_PSA-Prosperity-Dielectrics-FM32X223K251EMG_C692285.pdf; ComponentLink2Description: JLCPCB Part URL; ComponentLink2URL: https://jlcpcb.com/partdetail/C692285; ComponentLink3Description: LCSC Part URL; ComponentLink3URL: https://lcsc.com/product-detail/Multilayer-Ceramic-Capacitors-MLCC---SMD-SMT_PSAProsperity-Dielectrics-PSAProsperity-Dielectrics-FM32X223K251EMG_C692285.html
footprint CAP-1210 (1210 (3225M) Capacitor)
pins: 1, 2
